# Altium footprint library PcbLib1.PcbLib: 1016 footprints (part 32 of 64)
Each footprint in its own frame and in the unit in brackets; x right, y up, seen from the top. Pads: shape width x height; smd on the part's side, far side on the other; paste and mask are expansions set on the pad; w line width, h text height; cw(c..) or ccw(c..) is an arc to the next point about the centre after c.
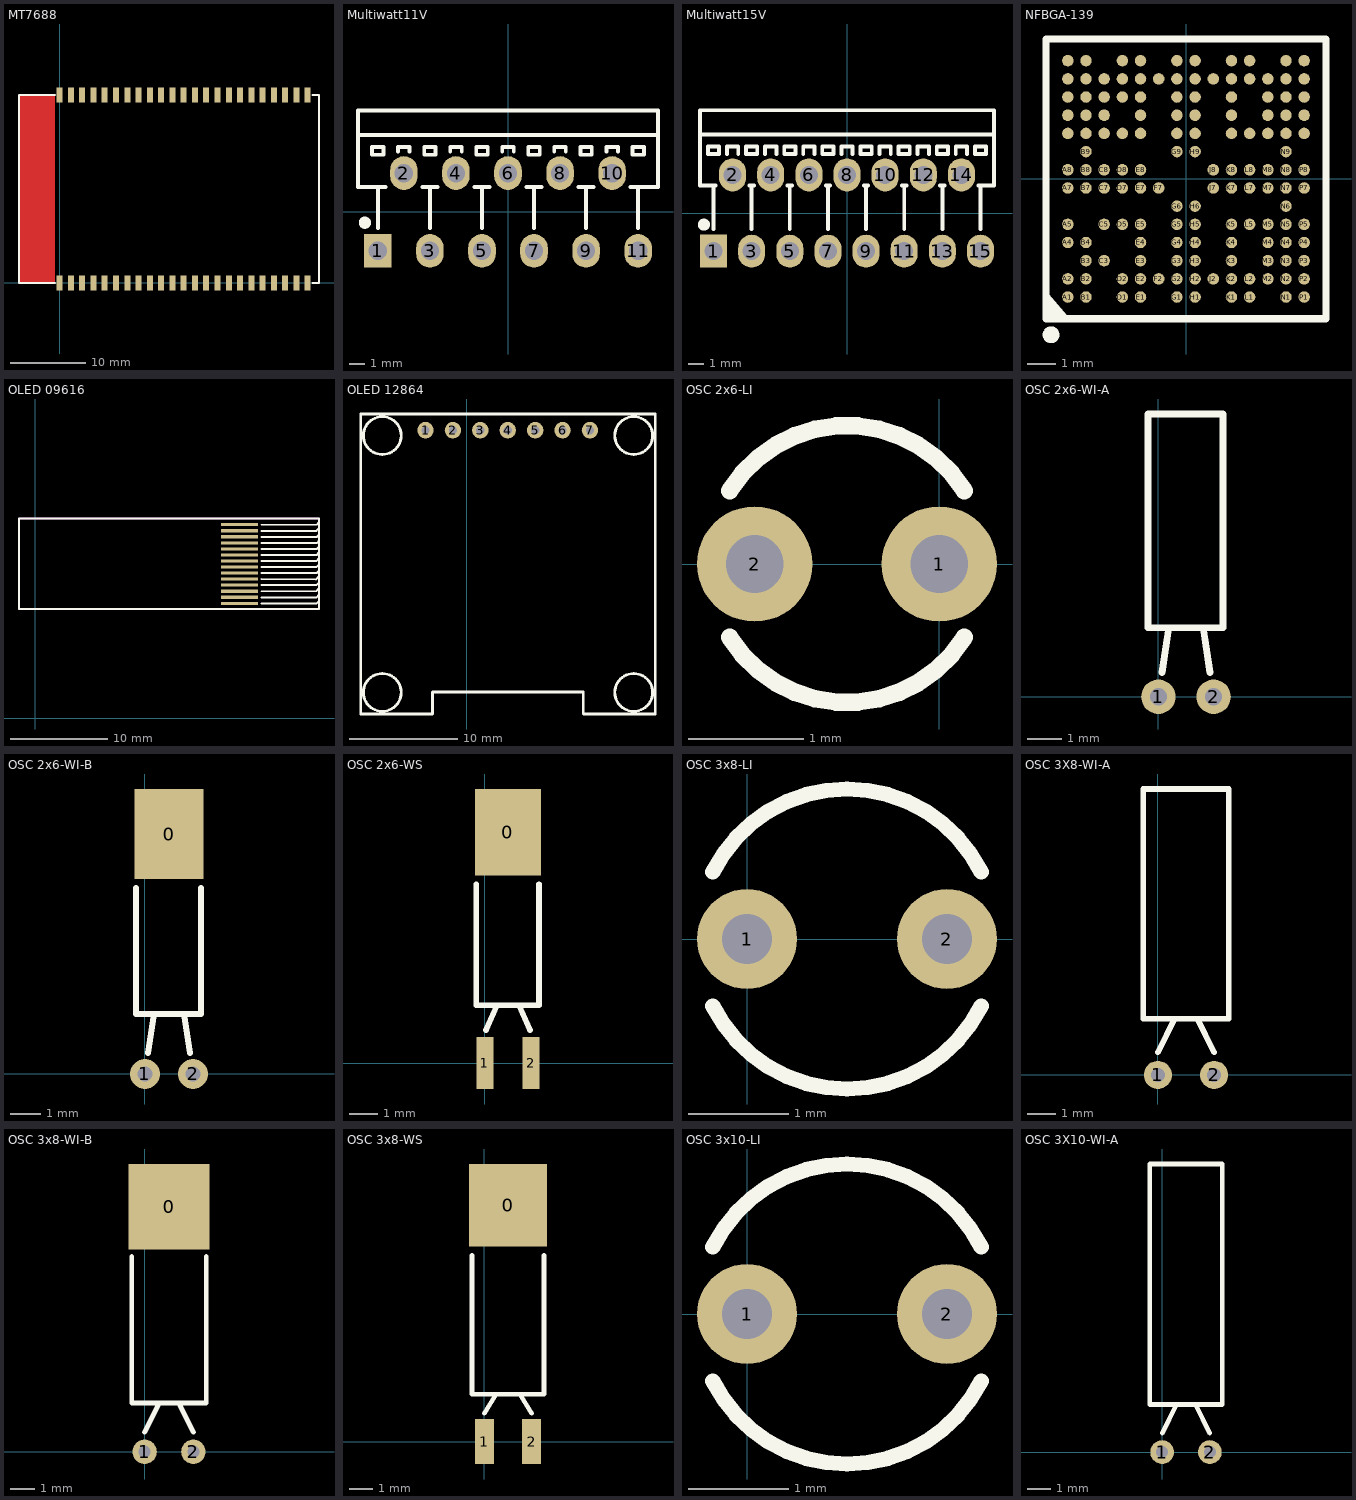
[diagram p31: the footprints below, top view; thin cyan lines are the x and y axes]

## MT7688 [mm] "WiFi模块"
pads (46):
  rect 0.8x2 smd: 1(0,0) 2(1.5,0) 3(3,0) 4(4.5,0) 5(6,0) 6(7.5,0) 7(9,0) 8(10.5,0) 9(12,0) 10(13.5,0) 11(15,0) 12(16.5,0) 13(18,0) 14(19.5,0) 15(21,0) 16(22.5,0) 17(24,0) 18(25.5,0) 19(27,0) 20(28.5,0) 21(30,0) 22(31.5,0) 23(33,0) 24(33,25) 25(31.5,25) 26(30,25) 27(28.5,25) 28(27,25) 29(25.5,25) 30(24,25) 31(22.5,25) 32(21,25) 33(19.5,25) 34(18,25) 35(16.5,25) 36(15,25) 37(13.5,25) 38(12,25) 39(10.5,25) 40(9,25) 41(7.5,25) 42(6,25) 43(4.5,25) 44(3,25) 45(1.5,25) 46(0,25)
Top Layer:
  pour cut-out: -5.4,25.019 -0.635,25.019 -0.635,0 -5.4,0
Bottom Layer:
  pour cut-out: -5.4,25.019 -0.635,25.019 -0.635,0 -5.4,0
Top Overlay:
  lines w0.254: -0.635,0 -5.4,0 -5.4,25.019 -0.635,25.019 ; 33.63,25.019 34.5,25.019 34.5,0 33.655,0

## Multiwatt11V [mm]
pads (11):
  rect 1.8x2.2 hole 1.2: 1(-8.5,-2.54)
  oval 1.8x2.2 hole 1.2: 2(-6.8,2.54) 3(-5.1,-2.54) 4(-3.4,2.54) 5(-1.7,-2.54) 6(0,2.54) 7(1.7,-2.54) 8(3.4,2.54) 9(5.1,-2.54) 10(6.8,2.54) 11(8.5,-2.54)
Top Overlay:
  circle w0.4: c-9.35,-0.7 r0.2
  lines w0.254: -8.5,-1.06 -8.5,1.64 ; -8,1.64 -9.8,1.64 -9.8,5.04 ; -7.175,3.94 -7.175,4.24 -6.425,4.24 -6.425,3.94 ; -5.6,1.64 -4.6,1.64 ; -5.1,-1.06 -5.1,1.64 ; -3.775,3.94 -3.775,4.24 -3.025,4.24 -3.025,3.94 ; -2.2,1.64 -1.2,1.64 ; -1.7,-1.06 -1.7,1.64 ; -0.375,3.94 -0.375,4.24 0.375,4.24 0.375,3.94 ; 1.2,1.64 2.2,1.64 ; 1.7,-1.06 1.7,1.64 ; 3.025,3.94 3.025,4.24 3.775,4.24 3.775,3.94 ; 4.6,1.64 5.6,1.64 ; 5.1,-1.06 5.1,1.64 ; 6.425,3.94 6.425,4.24 7.175,4.24 7.175,3.94 ; 8,1.64 9.8,1.64 9.8,5.04 ; 8.5,-1.06 8.5,1.64 ; -9.8,5.04 9.8,5.04 ; -9.8,5.04 -9.8,6.64 9.8,6.64 9.8,5.04 ; -8.875,3.74 -8.125,3.74 -8.125,4.24 -8.875,4.24 -8.875,3.74 ; -5.475,3.74 -5.475,4.24 -4.725,4.24 -4.725,3.74 -5.475,3.74 ; -2.075,3.74 -2.075,4.24 -1.325,4.24 -1.325,3.74 -2.075,3.74 ; 1.325,3.74 1.325,4.24 2.075,4.24 2.075,3.74 1.325,3.74 ; 4.725,3.74 4.725,4.24 5.475,4.24 5.475,3.74 4.725,3.74 ; 8.125,3.74 8.875,3.74 8.875,4.24 8.125,4.24 8.125,3.74

## Multiwatt15V [mm]
pads (15):
  rect 1.8x2.2 hole 1.2: 1(-8.89,-2.54)
  oval 1.8x2.2 hole 1.2: 2(-7.62,2.54) 3(-6.35,-2.54) 4(-5.08,2.54) 5(-3.81,-2.54) 6(-2.54,2.54) 7(-1.27,-2.54) 8(0,2.54) 9(1.27,-2.54) 10(2.54,2.54) 11(3.81,-2.54) 12(5.08,2.54) 13(6.35,-2.54) 14(7.62,2.54) 15(8.89,-2.54)
Top Overlay:
  circle w0.4: c-9.525,-0.775 r0.2
  lines w0.254: -8.89,-1.06 -8.89,1.84 ; -8.74,1.84 -9.8,1.84 -9.8,5.24 ; -7.995,3.94 -7.995,4.44 -7.245,4.44 -7.245,3.94 ; -6.5,1.84 -6.2,1.84 ; -6.35,-1.06 -6.35,1.84 ; -5.455,3.94 -5.455,4.44 -4.705,4.44 -4.705,3.94 ; -3.96,1.84 -3.66,1.84 ; -3.81,-1.06 -3.81,1.84 ; -2.915,3.94 -2.915,4.44 -2.165,4.44 -2.165,3.94 ; -1.42,1.84 -1.12,1.84 ; -1.27,-1.06 -1.27,1.84 ; -0.375,3.94 -0.375,4.44 0.375,4.44 0.375,3.94 ; 1.12,1.84 1.42,1.84 ; 1.27,-1.06 1.27,1.84 ; 2.165,3.94 2.165,4.44 2.915,4.44 2.915,3.94 ; 3.66,1.84 3.96,1.84 ; 3.81,-1.06 3.81,1.84 ; 4.705,3.94 4.705,4.44 5.455,4.44 5.455,3.94 ; 6.2,1.84 6.5,1.84 ; 6.35,-1.06 6.35,1.84 ; 7.245,3.94 7.245,4.44 7.995,4.44 7.995,3.94 ; 8.74,1.84 9.8,1.84 9.8,5.24 ; 8.89,-1.06 8.89,1.84 ; -9.8,5.24 -9.8,6.84 9.8,6.84 9.8,5.24 ; -9.8,5.24 9.8,5.24 ; -9.265,3.94 -9.265,4.44 -8.515,4.44 -8.515,3.94 -9.265,3.94 ; -6.725,3.94 -6.725,4.44 -5.975,4.44 -5.975,3.94 -6.725,3.94 ; -4.185,3.94 -4.185,4.44 -3.435,4.44 -3.435,3.94 -4.185,3.94 ; -1.645,3.94 -0.895,3.94 -0.895,4.44 -1.645,4.44 -1.645,3.94 ; 0.895,3.94 0.895,4.44 1.645,4.44 1.645,3.94 0.895,3.94 ; 3.435,3.94 3.435,4.44 4.185,4.44 4.185,3.94 3.435,3.94 ; 5.975,3.94 5.975,4.44 6.725,4.44 6.725,3.94 5.975,3.94 ; 8.515,3.94 9.265,3.94 9.265,4.44 8.515,4.44 8.515,3.94

## NFBGA-139 [mm]
pads (139):
  round 0.41 smd mask+0.051: A1(-4.225,-4.225) A2(-4.225,-3.575) A4(-4.225,-2.275) A5(-4.225,-1.625) A7(-4.225,-0.325) A8(-4.225,0.325) A10(-4.225,1.625) A11(-4.225,2.275) A12(-4.225,2.925) A13(-4.225,3.575) A14(-4.225,4.225) B1(-3.575,-4.225) B2(-3.575,-3.575) B3(-3.575,-2.925) B4(-3.575,-2.275) B7(-3.575,-0.325) B8(-3.575,0.325) B9(-3.575,0.975) B10(-3.575,1.625) B11(-3.575,2.275) B12(-3.575,2.925) B13(-3.575,3.575) B14(-3.575,4.225) C3(-2.925,-2.925) C5(-2.925,-1.625) C7(-2.925,-0.325) C8(-2.925,0.325) C10(-2.925,1.625) C11(-2.925,2.275) C12(-2.925,2.925) C13(-2.925,3.575) D1(-2.275,-4.225) D2(-2.275,-3.575) D5(-2.275,-1.625) D7(-2.275,-0.325) D8(-2.275,0.325) D10(-2.275,1.625) D12(-2.275,2.925) D13(-2.275,3.575) D14(-2.275,4.225) E1(-1.625,-4.225) E2(-1.625,-3.575) E3(-1.625,-2.925) E4(-1.625,-2.275) E5(-1.625,-1.625) E7(-1.625,-0.325) E8(-1.625,0.325) E10(-1.625,1.625) E11(-1.625,2.275) E12(-1.625,2.925) E13(-1.625,3.575) E14(-1.625,4.225) F2(-0.975,-3.575) F7(-0.975,-0.325) F13(-0.975,3.575) G1(-0.325,-4.225) G2(-0.325,-3.575) G3(-0.325,-2.925) G4(-0.325,-2.275) G5(-0.325,-1.625) G6(-0.325,-0.975) G9(-0.325,0.975) G10(-0.325,1.625) G11(-0.325,2.275) G12(-0.325,2.925) G13(-0.325,3.575) G14(-0.325,4.225) H1(0.325,-4.225) H2(0.325,-3.575) H3(0.325,-2.925) H4(0.325,-2.275) H5(0.325,-1.625) H6(0.325,-0.975) H9(0.325,0.975) H10(0.325,1.625) H11(0.325,2.275) H12(0.325,2.925) H13(0.325,3.575) H14(0.325,4.225) J2(0.975,-3.575) J7(0.975,-0.325) J8(0.975,0.325) J13(0.975,3.575) K1(1.625,-4.225) K2(1.625,-3.575) K3(1.625,-2.925) K4(1.625,-2.275) K5(1.625,-1.625) K7(1.625,-0.325) K8(1.625,0.325) K10(1.625,1.625) K11(1.625,2.275) K12(1.625,2.925) K13(1.625,3.575) K14(1.625,4.225) L1(2.275,-4.225) L2(2.275,-3.575) L5(2.275,-1.625) L7(2.275,-0.325) L8(2.275,0.325) L10(2.275,1.625) L13(2.275,3.575) L14(2.275,4.225) M2(2.925,-3.575) M3(2.925,-2.925) M4(2.925,-2.275) M5(2.925,-1.625) M7(2.925,-0.325) M8(2.925,0.325) M10(2.925,1.625) M11(2.925,2.275) M12(2.925,2.925) M13(2.925,3.575) N1(3.575,-4.225) N2(3.575,-3.575) N3(3.575,-2.925) N4(3.575,-2.275) N5(3.575,-1.625) N6(3.575,-0.975) N7(3.575,-0.325) N8(3.575,0.325) N9(3.575,0.975) N10(3.575,1.625) N11(3.575,2.275) N12(3.575,2.925) N13(3.575,3.575) N14(3.575,4.225) P1(4.225,-4.225) P2(4.225,-3.575) P3(4.225,-2.925) P4(4.225,-2.275) P5(4.225,-1.625) P7(4.225,-0.325) P8(4.225,0.325) P10(4.225,1.625) P11(4.225,2.275) P12(4.225,2.925) P13(4.225,3.575) P14(4.225,4.225)
Top Overlay:
  circle w0.3: c-4.825,-5.575 r0.15
  lines w0.254: -5,-4.2 -4.35,-4.95 ; -4.975,-4.525 -4.625,-4.925 ; -4.625,-4.925 -5,-4.75 -4.625,-4.925 ; -5,-5 -5,5 5,5 5,-5 -5,-5

## OLED 09616 [mm]
pads (14):
  rect 3.81x0.32 smd: 1(20.93,11.76) 2(20.93,12.38) 3(20.93,13) 4(20.93,13.62) 5(20.93,14.24) 6(20.93,14.86) 7(20.93,15.48) 8(20.93,16.1) 9(20.93,16.72) 10(20.93,17.34) 11(20.93,17.96) 12(20.93,18.58) 13(20.93,19.2) 14(20.93,19.82)
Top Overlay:
  lines w0.2: 23.165,11.76 28.829,11.76 29.058,11.989 ; 23.165,12.38 28.839,12.38 29.083,12.624 ; 23.165,12.999 28.798,12.999 29.032,13.233 ; 23.165,13.618 28.808,13.618 29.058,13.868 ; 23.165,14.238 28.778,14.224 ; 23.165,14.857 28.827,14.857 29.058,15.088 ; 23.165,15.476 28.811,15.476 29.058,15.723 ; 23.165,16.096 28.821,16.096 29.083,16.358 ; 23.165,16.715 28.778,16.713 28.829,16.713 29.083,16.967 ; 23.165,17.335 28.866,17.335 29.083,17.551 ; 23.165,17.954 28.854,17.954 ; 23.165,18.573 28.86,18.573 29.07,18.783 ; 23.165,19.193 28.819,19.193 29.083,19.456 ; 23.165,19.812 28.854,19.812 ; 28.782,14.228 29.032,14.478 ; 28.829,19.812 28.854,19.812 ; 28.88,17.958 29.07,18.148 ; 29.083,20.041 28.854,19.812 ; -1.651,11.176 -1.651,20.447 29.083,20.447 29.083,11.176 -1.651,11.176
Mechanical 1:
  lines w0.2: -1.651,11.176 29.083,11.176 29.083,20.447 -1.651,20.447 -1.651,11.176
3D body "User Library-ER-OLED0_084.STEP": height 1.86, standoff 0, extent -1.635,11.205 29.068,20.405

## OLED 12864 [mil]
pads (7):
  round 60 hole 30: 1(-150,1260) 2(-50,1260) 3(50,1260) 4(150,1260) 5(250,1260) 6(350,1260) 7(450,1260)
Top Overlay:
  circle w10: c-307.72,1240.31 r68.9
  circle w10: c-307.72,303.31 r68.9
  circle w10: c609.61,303.31 r68.9
  circle w10: c609.61,1240.31 r68.9
  lines w10: -386.46,224.57 -386.46,1319.06 688.35,1319.06 688.35,224.57 426.54,224.57 425.35,225.75 425.35,304.57 -124.65,304.57 -124.65,224.57 -386.46,224.57
3D body "User Library-096OLED.STEP": height 24.42, standoff -126.58, extent -375.6,313.28 675.59,1187.95

## OSC 2x6-LI [mm]
pads (2):
  round 1 hole 0.5: 1(0,0) 2(-1.6,0)
Top Overlay:
  lines w0.152: -1.818,-0.636 ccw(c-0.8,0) 0.218,-0.636 ; -1.818,0.636 cw(c-0.8,0) 0.218,0.636
3D body "OSC-2x6-LI-.STEP": height 7.1, standoff -2.45, extent -1.762,-1.016 0.238,0.984

## OSC 2x6-WI-A [mm]
pads (2):
  round 1 hole 0.5: 1(0,0) 2(1.6,0)
Top Overlay:
  lines w0.2: 0.1,0.7 0.3,2 ; 1.3,2 1.5,0.7 ; -0.3,2 1.872,2 1.872,8.2 -0.3,8.2 -0.3,2
3D body "OSC-2x6-WI-A.STEP": height 2.05, standoff -2.6, extent -0.254,-0.142 1.746,8.016

## OSC 2x6-WI-B [mm]
pads (3):
  rect 2.3x3 smd: 0(0.8,8)
  round 1 hole 0.5: 1(0,0) 2(1.6,0)
Top Overlay:
  lines w0.2: -0.3,6.2 -0.3,2 1.872,2 1.872,6.2 ; 0.1,0.7 0.3,2 ; 1.3,2 1.5,0.7
3D body "OSC-2x6-WI-B.STEP": height 2.05, standoff -2.6, extent -0.254,-0.142 1.746,8.016

## OSC 2x6-WS [mm]
pads (3):
  rect 2.3x3 smd: 0(0.8,8)
  rect 0.6x1.8 smd: 1(0,0) 2(1.6,0)
Top Overlay:
  lines w0.2: -0.3,6.2 -0.3,2 1.872,2 1.872,6.2 ; 0.038,1.143 0.419,2 ; 1.181,2 1.562,1.143
3D body "OSC-2x6-WS-.STEP": height 2.01, standoff -0.04, extent -0.222,-0.49 1.778,8.11

## OSC 3x8-LI [mm]
pads (2):
  round 1 hole 0.5: 1(0,0) 2(2,0)
Top Overlay:
  lines w0.152: -0.342,-0.671 ccw(c1,0) 2.342,-0.671 ; -0.342,0.671 cw(c1,0) 2.342,0.671
3D body "OSC-3x8-LI-.STEP": height 9.1, standoff -2.5, extent -0.484,-1.476 2.516,1.524

## OSC 3X8-WI-A [mm]
pads (2):
  round 1 hole 0.5: 1(0,0) 2(2,0)
Top Overlay:
  lines w0.2: 0,0.8 0.6,2 ; 1.4,2 2,0.8 ; -0.524,2 -0.524,10.16 2.524,10.16 2.524,2 -0.524,2
3D body "OSC-3x8-WI-A.STEP": height 3.03, standoff -2.6, extent -0.484,-0.127 2.516,10.052

## OSC 3x8-WI-B [mm]
pads (3):
  rect 3.3x3.5 smd: 0(1,10.033)
  round 1 hole 0.5: 1(0,0) 2(2,0)
Top Overlay:
  lines w0.2: -0.524,8.001 -0.524,2 2.524,2 2.524,8.001 ; 0,0.8 0.6,2 ; 1.4,2 2,0.8
3D body "OSC-3x8-WI-B.STEP": height 3.03, standoff -2.6, extent -0.484,-0.127 2.516,10.052

## OSC 3x8-WS [mm]
pads (3):
  rect 3.3x3.5 smd: 0(1,10)
  rect 0.8x1.9 smd: 1(0,0) 2(2,0)
Top Overlay:
  lines w0.2: -0.524,7.874 -0.524,2 2.524,2 2.524,7.874 ; 0,1.2 0.5,2 ; 1.5,2 2,1.2
3D body "OSC-3x8-WS-.STEP": height 3.03, standoff 0, extent -0.381,-0.424 2.619,10.076

## OSC 3x10-LI [mm]
pads (2):
  round 1 hole 0.5: 1(0,0) 2(2,0)
Top Overlay:
  lines w0.152: -0.342,-0.671 ccw(c1,0) 2.342,-0.671 ; -0.342,0.671 cw(c1,0) 2.342,0.671
3D body "OSC-3x10-LI-.STEP": height 11.1, standoff -2.5, extent -0.484,-1.524 2.516,1.476

## OSC 3X10-WI-A [mm]
pads (2):
  round 1 hole 0.5: 1(0,0) 2(2,0)
Top Overlay:
  lines w0.2: 0,0.8 0.6,2 ; 1.4,2 2,0.8 ; -0.524,2 2.524,2 2.524,12.1 -0.524,12.1 -0.524,2
3D body "OSC-3x10-WI-A.STEP": height 3.03, standoff -2.6, extent -0.508,-0.127 2.492,12.052